# Altium footprint library con-samtec.PCBLIB: 805 footprints (part 17 of 55)
Each footprint in its own frame and in the unit in brackets; x right, y up, seen from the top. Pads: shape width x height; smd on the part's side, far side on the other; paste and mask are expansions set on the pad; w line width, h text height; cw(c..) or ccw(c..) is an arc to the next point about the centre after c.
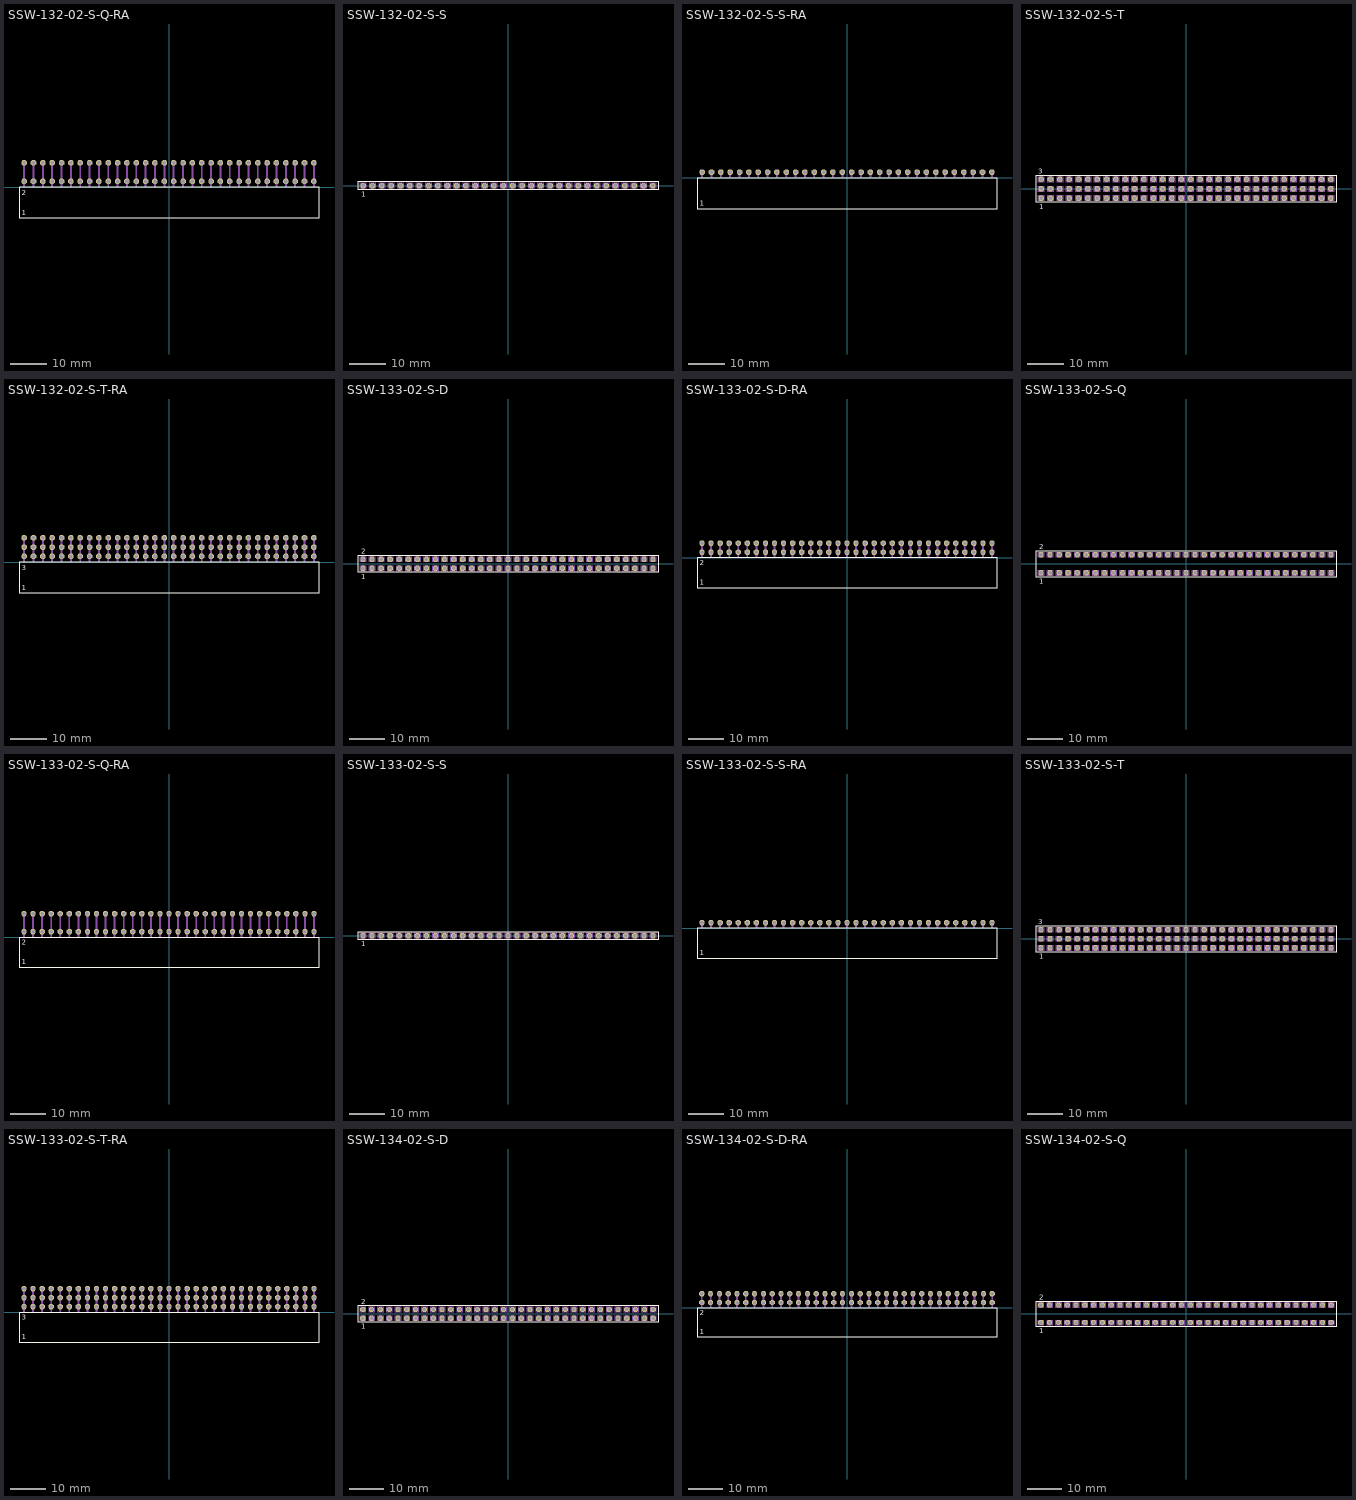
[diagram p16: the footprints below, top view; thin cyan lines are the x and y axes]

## SSW-132-02-S-Q-RA [mil]
pads (64):
  oct 59.06x59.06 hole 39.37: 1(-1550,60) 2(-1550,260) 3(-1450,60) 4(-1450,260) 5(-1350,60) 6(-1350,260) 7(-1250,60) 8(-1250,260) 9(-1150,60) 10(-1150,260) 11(-1050,60) 12(-1050,260) 13(-950,60) 14(-950,260) 15(-850,60) 16(-850,260) 17(-750,60) 18(-750,260) 19(-650,60) 20(-650,260) 21(-550,60) 22(-550,260) 23(-450,60) 24(-450,260) 25(-350,60) 26(-350,260) 27(-250,60) 28(-250,260) 29(-150,60) 30(-150,260) 31(-50,60) 32(-50,260) 33(50,60) 34(50,260) 35(150,60) 36(150,260) 37(250,60) 38(250,260) 39(350,60) 40(350,260) 41(450,60) 42(450,260) 43(550,60) 44(550,260) 45(650,60) 46(650,260) 47(750,60) 48(750,260) 49(850,60) 50(850,260) 51(950,60) 52(950,260) 53(1050,60) 54(1050,260) 55(1150,60) 56(1150,260) 57(1250,60) 58(1250,260) 59(1350,60) 60(1350,260) 61(1450,60) 62(1450,260) 63(1550,60) 64(1550,260)
Top Overlay:
  lines w8: -1605.08,-330.55 1605.08,-330.55 1605.08,-4.17 -1605.08,-4.17 -1605.08,-330.55
  text "1" at -1573.43,-301.18 h56.1
  text "2" at -1576.38,-86.61 h56.1
Mechanical 16:
  rectangle: -1560,0 -1540,270
  rectangle: -1460,0 -1440,270
  rectangle: -1360,0 -1340,270
  rectangle: -1260,0 -1240,270
  rectangle: -1160,0 -1140,270
  rectangle: -1060,0 -1040,270
  rectangle: -960,0 -940,270
  rectangle: -860,0 -840,270
  rectangle: -760,0 -740,270
  rectangle: -660,0 -640,270
  rectangle: -560,0 -540,270
  rectangle: -460,0 -440,270
  rectangle: -360,0 -340,270
  rectangle: -260,0 -240,270
  rectangle: -160,0 -140,270
  rectangle: -60,0 -40,270
  rectangle: 40,0 60,270
  rectangle: 140,0 160,270
  rectangle: 240,0 260,270
  rectangle: 340,0 360,270
  rectangle: 440,0 460,270
  rectangle: 540,0 560,270
  rectangle: 640,0 660,270
  rectangle: 740,0 760,270
  rectangle: 840,0 860,270
  rectangle: 940,0 960,270
  rectangle: 1040,0 1060,270
  rectangle: 1140,0 1160,270
  rectangle: 1240,0 1260,270
  rectangle: 1340,0 1360,270
  rectangle: 1440,0 1460,270
  rectangle: 1540,0 1560,270

## SSW-132-02-S-S [mm]
pads (32):
  oct 1.5x1.5 hole 1: 1(-39.37,0) 2(-36.83,0) 3(-34.29,0) 4(-31.75,0) 5(-29.21,0) 6(-26.67,0) 7(-24.13,0) 8(-21.59,0) 9(-19.05,0) 10(-16.51,0) 11(-13.97,0) 12(-11.43,0) 13(-8.89,0) 14(-6.35,0) 15(-3.81,0) 16(-1.27,0) 17(1.27,0) 18(3.81,0) 19(6.35,0) 20(8.89,0) 21(11.43,0) 22(13.97,0) 23(16.51,0) 24(19.05,0) 25(21.59,0) 26(24.13,0) 27(26.67,0) 28(29.21,0) 29(31.75,0) 30(34.29,0) 31(36.83,0) 32(39.37,0)
Top Overlay:
  lines w0.203: -40.769,-1.155 40.769,-1.155 40.769,1.155 -40.769,1.155 -40.769,-1.155
  text "1" at -39.878,-3.048 h1.42
Mechanical 16:
  lines w0.203: -40.115,-0.745 -38.615,-0.745 -38.615,0.755 -40.115,0.755 -40.115,-0.745 ; -37.575,-0.745 -36.075,-0.745 -36.075,0.755 -37.575,0.755 -37.575,-0.745 ; -35.035,-0.745 -33.535,-0.745 -33.535,0.755 -35.035,0.755 -35.035,-0.745 ; -32.495,-0.745 -30.995,-0.745 -30.995,0.755 -32.495,0.755 -32.495,-0.745 ; -29.955,-0.745 -28.455,-0.745 -28.455,0.755 -29.955,0.755 -29.955,-0.745 ; -27.415,-0.745 -25.915,-0.745 -25.915,0.755 -27.415,0.755 -27.415,-0.745 ; -24.875,-0.745 -23.375,-0.745 -23.375,0.755 -24.875,0.755 -24.875,-0.745 ; -22.335,-0.745 -20.835,-0.745 -20.835,0.755 -22.335,0.755 -22.335,-0.745 ; -19.795,-0.745 -18.295,-0.745 -18.295,0.755 -19.795,0.755 -19.795,-0.745 ; -17.255,-0.745 -15.755,-0.745 -15.755,0.755 -17.255,0.755 -17.255,-0.745 ; -14.715,-0.745 -13.215,-0.745 -13.215,0.755 -14.715,0.755 -14.715,-0.745 ; -12.175,-0.745 -10.675,-0.745 -10.675,0.755 -12.175,0.755 -12.175,-0.745 ; -9.635,-0.745 -8.135,-0.745 -8.135,0.755 -9.635,0.755 -9.635,-0.745 ; -7.095,-0.745 -5.595,-0.745 -5.595,0.755 -7.095,0.755 -7.095,-0.745 ; -4.555,-0.745 -3.055,-0.745 -3.055,0.755 -4.555,0.755 -4.555,-0.745 ; -2.015,-0.745 -0.515,-0.745 -0.515,0.755 -2.015,0.755 -2.015,-0.745 ; 0.525,-0.745 2.025,-0.745 2.025,0.755 0.525,0.755 0.525,-0.745 ; 3.065,-0.745 4.565,-0.745 4.565,0.755 3.065,0.755 3.065,-0.745 ; 5.605,-0.745 7.105,-0.745 7.105,0.755 5.605,0.755 5.605,-0.745 ; 8.145,-0.745 9.645,-0.745 9.645,0.755 8.145,0.755 8.145,-0.745 ; 10.685,-0.745 12.185,-0.745 12.185,0.755 10.685,0.755 10.685,-0.745 ; 13.225,-0.745 14.725,-0.745 14.725,0.755 13.225,0.755 13.225,-0.745 ; 15.765,-0.745 17.265,-0.745 17.265,0.755 15.765,0.755 15.765,-0.745 ; 18.305,-0.745 19.805,-0.745 19.805,0.755 18.305,0.755 18.305,-0.745 ; 20.845,-0.745 22.345,-0.745 22.345,0.755 20.845,0.755 20.845,-0.745 ; 23.385,-0.745 24.885,-0.745 24.885,0.755 23.385,0.755 23.385,-0.745 ; 25.925,-0.745 27.425,-0.745 27.425,0.755 25.925,0.755 25.925,-0.745 ; 28.465,-0.745 29.965,-0.745 29.965,0.755 28.465,0.755 28.465,-0.745 ; 31.005,-0.745 32.505,-0.745 32.505,0.755 31.005,0.755 31.005,-0.745 ; 33.545,-0.745 35.045,-0.745 35.045,0.755 33.545,0.755 33.545,-0.745 ; 36.085,-0.745 37.585,-0.745 37.585,0.755 36.085,0.755 36.085,-0.745 ; 38.625,-0.745 40.125,-0.745 40.125,0.755 38.625,0.755 38.625,-0.745

## SSW-132-02-S-S-RA [mil]
pads (32):
  oct 59.06x59.06 hole 39.37: 1(-1550,60) 2(-1450,60) 3(-1350,60) 4(-1250,60) 5(-1150,60) 6(-1050,60) 7(-950,60) 8(-850,60) 9(-750,60) 10(-650,60) 11(-550,60) 12(-450,60) 13(-350,60) 14(-250,60) 15(-150,60) 16(-50,60) 17(50,60) 18(150,60) 19(250,60) 20(350,60) 21(450,60) 22(550,60) 23(650,60) 24(750,60) 25(850,60) 26(950,60) 27(1050,60) 28(1150,60) 29(1250,60) 30(1350,60) 31(1450,60) 32(1550,60)
Top Overlay:
  lines w8: -1605.08,-330.55 1605.08,-330.55 1605.08,-4.17 -1605.08,-4.17 -1605.08,-330.55
  text "1" at -1573.43,-301.18 h56.1
Mechanical 16:
  rectangle: -1560,0 -1540,70
  rectangle: -1460,0 -1440,70
  rectangle: -1360,0 -1340,70
  rectangle: -1260,0 -1240,70
  rectangle: -1160,0 -1140,70
  rectangle: -1060,0 -1040,70
  rectangle: -960,0 -940,70
  rectangle: -860,0 -840,70
  rectangle: -760,0 -740,70
  rectangle: -660,0 -640,70
  rectangle: -560,0 -540,70
  rectangle: -460,0 -440,70
  rectangle: -360,0 -340,70
  rectangle: -260,0 -240,70
  rectangle: -160,0 -140,70
  rectangle: -60,0 -40,70
  rectangle: 40,0 60,70
  rectangle: 140,0 160,70
  rectangle: 240,0 260,70
  rectangle: 340,0 360,70
  rectangle: 440,0 460,70
  rectangle: 540,0 560,70
  rectangle: 640,0 660,70
  rectangle: 740,0 760,70
  rectangle: 840,0 860,70
  rectangle: 940,0 960,70
  rectangle: 1040,0 1060,70
  rectangle: 1140,0 1160,70
  rectangle: 1240,0 1260,70
  rectangle: 1340,0 1360,70
  rectangle: 1440,0 1460,70
  rectangle: 1540,0 1560,70

## SSW-132-02-S-T [mm]
pads (96):
  oct 1.5x1.5 hole 1: 1(-39.37,-2.54) 2(-39.37,0) 3(-39.37,2.54) 4(-36.83,-2.54) 5(-36.83,0) 6(-36.83,2.54) 7(-34.29,-2.54) 8(-34.29,0) 9(-34.29,2.54) 10(-31.75,-2.54) 11(-31.75,0) 12(-31.75,2.54) 13(-29.21,-2.54) 14(-29.21,0) 15(-29.21,2.54) 16(-26.67,-2.54) 17(-26.67,0) 18(-26.67,2.54) 19(-24.13,-2.54) 20(-24.13,0) 21(-24.13,2.54) 22(-21.59,-2.54) 23(-21.59,0) 24(-21.59,2.54) 25(-19.05,-2.54) 26(-19.05,0) 27(-19.05,2.54) 28(-16.51,-2.54) 29(-16.51,0) 30(-16.51,2.54) 31(-13.97,-2.54) 32(-13.97,0) 33(-13.97,2.54) 34(-11.43,-2.54) 35(-11.43,0) 36(-11.43,2.54) 37(-8.89,-2.54) 38(-8.89,0) 39(-8.89,2.54) 40(-6.35,-2.54) 41(-6.35,0) 42(-6.35,2.54) 43(-3.81,-2.54) 44(-3.81,0) 45(-3.81,2.54) 46(-1.27,-2.54) 47(-1.27,0) 48(-1.27,2.54) 49(1.27,-2.54) 50(1.27,0) 51(1.27,2.54) 52(3.81,-2.54) 53(3.81,0) 54(3.81,2.54) 55(6.35,-2.54) 56(6.35,0) 57(6.35,2.54) 58(8.89,-2.54) 59(8.89,0) 60(8.89,2.54) 61(11.43,-2.54) 62(11.43,0) 63(11.43,2.54) 64(13.97,-2.54) 65(13.97,0) 66(13.97,2.54) 67(16.51,-2.54) 68(16.51,0) 69(16.51,2.54) 70(19.05,-2.54) 71(19.05,0) 72(19.05,2.54) 73(21.59,-2.54) 74(21.59,0) 75(21.59,2.54) 76(24.13,-2.54) 77(24.13,0) 78(24.13,2.54) 79(26.67,-2.54) 80(26.67,0) 81(26.67,2.54) 82(29.21,-2.54) 83(29.21,0) 84(29.21,2.54) 85(31.75,-2.54) 86(31.75,0) 87(31.75,2.54) 88(34.29,-2.54) 89(34.29,0) 90(34.29,2.54) 91(36.83,-2.54) 92(36.83,0) 93(36.83,2.54) 94(39.37,-2.54) 95(39.37,0) 96(39.37,2.54)
Top Overlay:
  lines w0.203: -40.769,-3.695 40.769,-3.695 40.769,3.695 -40.769,3.695 -40.769,-3.695
  text "1" at -39.878,-5.588 h1.42
  text "3" at -40.132,4.064 h1.42
Mechanical 16:
  drawing of 384 lines, arcs and shapes, not listed

## SSW-132-02-S-T-RA [mil]
pads (96):
  oct 59.06x59.06 hole 39.37: 1(-1550,60) 2(-1550,160) 3(-1550,260) 4(-1450,60) 5(-1450,160) 6(-1450,260) 7(-1350,60) 8(-1350,160) 9(-1350,260) 10(-1250,60) 11(-1250,160) 12(-1250,260) 13(-1150,60) 14(-1150,160) 15(-1150,260) 16(-1050,60) 17(-1050,160) 18(-1050,260) 19(-950,60) 20(-950,160) 21(-950,260) 22(-850,60) 23(-850,160) 24(-850,260) 25(-750,60) 26(-750,160) 27(-750,260) 28(-650,60) 29(-650,160) 30(-650,260) 31(-550,60) 32(-550,160) 33(-550,260) 34(-450,60) 35(-450,160) 36(-450,260) 37(-350,60) 38(-350,160) 39(-350,260) 40(-250,60) 41(-250,160) 42(-250,260) 43(-150,60) 44(-150,160) 45(-150,260) 46(-50,60) 47(-50,160) 48(-50,260) 49(50,60) 50(50,160) 51(50,260) 52(150,60) 53(150,160) 54(150,260) 55(250,60) 56(250,160) 57(250,260) 58(350,60) 59(350,160) 60(350,260) 61(450,60) 62(450,160) 63(450,260) 64(550,60) 65(550,160) 66(550,260) 67(650,60) 68(650,160) 69(650,260) 70(750,60) 71(750,160) 72(750,260) 73(850,60) 74(850,160) 75(850,260) 76(950,60) 77(950,160) 78(950,260) 79(1050,60) 80(1050,160) 81(1050,260) 82(1150,60) 83(1150,160) 84(1150,260) 85(1250,60) 86(1250,160) 87(1250,260) 88(1350,60) 89(1350,160) 90(1350,260) 91(1450,60) 92(1450,160) 93(1450,260) 94(1550,60) 95(1550,160) 96(1550,260)
Top Overlay:
  lines w8: -1605.08,-330.55 1605.08,-330.55 1605.08,-4.17 -1605.08,-4.17 -1605.08,-330.55
  text "1" at -1573.43,-301.18 h56.1
  text "3" at -1576.38,-86.61 h56.1
Mechanical 16:
  rectangle: -1560,0 -1540,270
  rectangle: -1460,0 -1440,270
  rectangle: -1360,0 -1340,270
  rectangle: -1260,0 -1240,270
  rectangle: -1160,0 -1140,270
  rectangle: -1060,0 -1040,270
  rectangle: -960,0 -940,270
  rectangle: -860,0 -840,270
  rectangle: -760,0 -740,270
  rectangle: -660,0 -640,270
  rectangle: -560,0 -540,270
  rectangle: -460,0 -440,270
  rectangle: -360,0 -340,270
  rectangle: -260,0 -240,270
  rectangle: -160,0 -140,270
  rectangle: -60,0 -40,270
  rectangle: 40,0 60,270
  rectangle: 140,0 160,270
  rectangle: 240,0 260,270
  rectangle: 340,0 360,270
  rectangle: 440,0 460,270
  rectangle: 540,0 560,270
  rectangle: 640,0 660,270
  rectangle: 740,0 760,270
  rectangle: 840,0 860,270
  rectangle: 940,0 960,270
  rectangle: 1040,0 1060,270
  rectangle: 1140,0 1160,270
  rectangle: 1240,0 1260,270
  rectangle: 1340,0 1360,270
  rectangle: 1440,0 1460,270
  rectangle: 1540,0 1560,270

## SSW-133-02-S-D [mm]
pads (66):
  oct 1.5x1.5 hole 1: 1(-40.64,-1.27) 2(-40.64,1.27) 3(-38.1,-1.27) 4(-38.1,1.27) 5(-35.56,-1.27) 6(-35.56,1.27) 7(-33.02,-1.27) 8(-33.02,1.27) 9(-30.48,-1.27) 10(-30.48,1.27) 11(-27.94,-1.27) 12(-27.94,1.27) 13(-25.4,-1.27) 14(-25.4,1.27) 15(-22.86,-1.27) 16(-22.86,1.27) 17(-20.32,-1.27) 18(-20.32,1.27) 19(-17.78,-1.27) 20(-17.78,1.27) 21(-15.24,-1.27) 22(-15.24,1.27) 23(-12.7,-1.27) 24(-12.7,1.27) 25(-10.16,-1.27) 26(-10.16,1.27) 27(-7.62,-1.27) 28(-7.62,1.27) 29(-5.08,-1.27) 30(-5.08,1.27) 31(-2.54,-1.27) 32(-2.54,1.27) 33(0,-1.27) 34(0,1.27) 35(2.54,-1.27) 36(2.54,1.27) 37(5.08,-1.27) 38(5.08,1.27) 39(7.62,-1.27) 40(7.62,1.27) 41(10.16,-1.27) 42(10.16,1.27) 43(12.7,-1.27) 44(12.7,1.27) 45(15.24,-1.27) 46(15.24,1.27) 47(17.78,-1.27) 48(17.78,1.27) 49(20.32,-1.27) 50(20.32,1.27) 51(22.86,-1.27) 52(22.86,1.27) 53(25.4,-1.27) 54(25.4,1.27) 55(27.94,-1.27) 56(27.94,1.27) 57(30.48,-1.27) 58(30.48,1.27) 59(33.02,-1.27) 60(33.02,1.27) 61(35.56,-1.27) 62(35.56,1.27) 63(38.1,-1.27) 64(38.1,1.27) 65(40.64,-1.27) 66(40.64,1.27)
Top Overlay:
  lines w0.203: -42.039,-2.425 42.039,-2.425 42.039,2.425 -42.039,2.425 -42.039,-2.425
  text "1" at -41.148,-4.318 h1.42
  text "2" at -41.148,2.794 h1.42
Mechanical 16:
  drawing of 264 lines, arcs and shapes, not listed

## SSW-133-02-S-D-RA [mil]
pads (66):
  oct 59.06x59.06 hole 39.37: 1(-1600,60) 2(-1600,160) 3(-1500,60) 4(-1500,160) 5(-1400,60) 6(-1400,160) 7(-1300,60) 8(-1300,160) 9(-1200,60) 10(-1200,160) 11(-1100,60) 12(-1100,160) 13(-1000,60) 14(-1000,160) 15(-900,60) 16(-900,160) 17(-800,60) 18(-800,160) 19(-700,60) 20(-700,160) 21(-600,60) 22(-600,160) 23(-500,60) 24(-500,160) 25(-400,60) 26(-400,160) 27(-300,60) 28(-300,160) 29(-200,60) 30(-200,160) 31(-100,60) 32(-100,160) 33(0,60) 34(0,160) 35(100,60) 36(100,160) 37(200,60) 38(200,160) 39(300,60) 40(300,160) 41(400,60) 42(400,160) 43(500,60) 44(500,160) 45(600,60) 46(600,160) 47(700,60) 48(700,160) 49(800,60) 50(800,160) 51(900,60) 52(900,160) 53(1000,60) 54(1000,160) 55(1100,60) 56(1100,160) 57(1200,60) 58(1200,160) 59(1300,60) 60(1300,160) 61(1400,60) 62(1400,160) 63(1500,60) 64(1500,160) 65(1600,60) 66(1600,160)
Top Overlay:
  lines w8: -1655.08,-330.55 1655.08,-330.55 1655.08,-4.17 -1655.08,-4.17 -1655.08,-330.55
  text "1" at -1623.43,-301.18 h56.1
  text "2" at -1626.38,-86.61 h56.1
Mechanical 16:
  rectangle: -1610,0 -1590,170
  rectangle: -1510,0 -1490,170
  rectangle: -1410,0 -1390,170
  rectangle: -1310,0 -1290,170
  rectangle: -1210,0 -1190,170
  rectangle: -1110,0 -1090,170
  rectangle: -1010,0 -990,170
  rectangle: -910,0 -890,170
  rectangle: -810,0 -790,170
  rectangle: -710,0 -690,170
  rectangle: -610,0 -590,170
  rectangle: -510,0 -490,170
  rectangle: -410,0 -390,170
  rectangle: -310,0 -290,170
  rectangle: -210,0 -190,170
  rectangle: -110,0 -90,170
  rectangle: -10,0 10,170
  rectangle: 90,0 110,170
  rectangle: 190,0 210,170
  rectangle: 290,0 310,170
  rectangle: 390,0 410,170
  rectangle: 490,0 510,170
  rectangle: 590,0 610,170
  rectangle: 690,0 710,170
  rectangle: 790,0 810,170
  rectangle: 890,0 910,170
  rectangle: 990,0 1010,170
  rectangle: 1090,0 1110,170
  rectangle: 1190,0 1210,170
  rectangle: 1290,0 1310,170
  rectangle: 1390,0 1410,170
  rectangle: 1490,0 1510,170
  rectangle: 1590,0 1610,170

## SSW-133-02-S-Q [mm]
pads (66):
  oct 1.5x1.5 hole 1: 1(-40.64,-2.54) 2(-40.64,2.54) 3(-38.1,-2.54) 4(-38.1,2.54) 5(-35.56,-2.54) 6(-35.56,2.54) 7(-33.02,-2.54) 8(-33.02,2.54) 9(-30.48,-2.54) 10(-30.48,2.54) 11(-27.94,-2.54) 12(-27.94,2.54) 13(-25.4,-2.54) 14(-25.4,2.54) 15(-22.86,-2.54) 16(-22.86,2.54) 17(-20.32,-2.54) 18(-20.32,2.54) 19(-17.78,-2.54) 20(-17.78,2.54) 21(-15.24,-2.54) 22(-15.24,2.54) 23(-12.7,-2.54) 24(-12.7,2.54) 25(-10.16,-2.54) 26(-10.16,2.54) 27(-7.62,-2.54) 28(-7.62,2.54) 29(-5.08,-2.54) 30(-5.08,2.54) 31(-2.54,-2.54) 32(-2.54,2.54) 33(0,-2.54) 34(0,2.54) 35(2.54,-2.54) 36(2.54,2.54) 37(5.08,-2.54) 38(5.08,2.54) 39(7.62,-2.54) 40(7.62,2.54) 41(10.16,-2.54) 42(10.16,2.54) 43(12.7,-2.54) 44(12.7,2.54) 45(15.24,-2.54) 46(15.24,2.54) 47(17.78,-2.54) 48(17.78,2.54) 49(20.32,-2.54) 50(20.32,2.54) 51(22.86,-2.54) 52(22.86,2.54) 53(25.4,-2.54) 54(25.4,2.54) 55(27.94,-2.54) 56(27.94,2.54) 57(30.48,-2.54) 58(30.48,2.54) 59(33.02,-2.54) 60(33.02,2.54) 61(35.56,-2.54) 62(35.56,2.54) 63(38.1,-2.54) 64(38.1,2.54) 65(40.64,-2.54) 66(40.64,2.54)
Top Overlay:
  lines w0.203: -42.039,-3.695 42.039,-3.695 42.039,3.695 -42.039,3.695 -42.039,-3.695
  text "1" at -41.148,-5.588 h1.42
  text "2" at -41.148,4.064 h1.42
Mechanical 16:
  drawing of 264 lines, arcs and shapes, not listed

## SSW-133-02-S-Q-RA [mil]
pads (66):
  oct 59.06x59.06 hole 39.37: 1(-1600,60) 2(-1600,260) 3(-1500,60) 4(-1500,260) 5(-1400,60) 6(-1400,260) 7(-1300,60) 8(-1300,260) 9(-1200,60) 10(-1200,260) 11(-1100,60) 12(-1100,260) 13(-1000,60) 14(-1000,260) 15(-900,60) 16(-900,260) 17(-800,60) 18(-800,260) 19(-700,60) 20(-700,260) 21(-600,60) 22(-600,260) 23(-500,60) 24(-500,260) 25(-400,60) 26(-400,260) 27(-300,60) 28(-300,260) 29(-200,60) 30(-200,260) 31(-100,60) 32(-100,260) 33(0,60) 34(0,260) 35(100,60) 36(100,260) 37(200,60) 38(200,260) 39(300,60) 40(300,260) 41(400,60) 42(400,260) 43(500,60) 44(500,260) 45(600,60) 46(600,260) 47(700,60) 48(700,260) 49(800,60) 50(800,260) 51(900,60) 52(900,260) 53(1000,60) 54(1000,260) 55(1100,60) 56(1100,260) 57(1200,60) 58(1200,260) 59(1300,60) 60(1300,260) 61(1400,60) 62(1400,260) 63(1500,60) 64(1500,260) 65(1600,60) 66(1600,260)
Top Overlay:
  lines w8: -1655.08,-330.55 1655.08,-330.55 1655.08,-4.17 -1655.08,-4.17 -1655.08,-330.55
  text "1" at -1623.43,-301.18 h56.1
  text "2" at -1626.38,-86.61 h56.1
Mechanical 16:
  rectangle: -1610,0 -1590,270
  rectangle: -1510,0 -1490,270
  rectangle: -1410,0 -1390,270
  rectangle: -1310,0 -1290,270
  rectangle: -1210,0 -1190,270
  rectangle: -1110,0 -1090,270
  rectangle: -1010,0 -990,270
  rectangle: -910,0 -890,270
  rectangle: -810,0 -790,270
  rectangle: -710,0 -690,270
  rectangle: -610,0 -590,270
  rectangle: -510,0 -490,270
  rectangle: -410,0 -390,270
  rectangle: -310,0 -290,270
  rectangle: -210,0 -190,270
  rectangle: -110,0 -90,270
  rectangle: -10,0 10,270
  rectangle: 90,0 110,270
  rectangle: 190,0 210,270
  rectangle: 290,0 310,270
  rectangle: 390,0 410,270
  rectangle: 490,0 510,270
  rectangle: 590,0 610,270
  rectangle: 690,0 710,270
  rectangle: 790,0 810,270
  rectangle: 890,0 910,270
  rectangle: 990,0 1010,270
  rectangle: 1090,0 1110,270
  rectangle: 1190,0 1210,270
  rectangle: 1290,0 1310,270
  rectangle: 1390,0 1410,270
  rectangle: 1490,0 1510,270
  rectangle: 1590,0 1610,270

## SSW-133-02-S-S [mm]
pads (33):
  oct 1.5x1.5 hole 1: 1(-40.64,0) 2(-38.1,0) 3(-35.56,0) 4(-33.02,0) 5(-30.48,0) 6(-27.94,0) 7(-25.4,0) 8(-22.86,0) 9(-20.32,0) 10(-17.78,0) 11(-15.24,0) 12(-12.7,0) 13(-10.16,0) 14(-7.62,0) 15(-5.08,0) 16(-2.54,0) 17(0,0) 18(2.54,0) 19(5.08,0) 20(7.62,0) 21(10.16,0) 22(12.7,0) 23(15.24,0) 24(17.78,0) 25(20.32,0) 26(22.86,0) 27(25.4,0) 28(27.94,0) 29(30.48,0) 30(33.02,0) 31(35.56,0) 32(38.1,0) 33(40.64,0)
Top Overlay:
  lines w0.203: -42.039,-1.155 42.039,-1.155 42.039,1.155 -42.039,1.155 -42.039,-1.155
  text "1" at -41.148,-3.048 h1.42
Mechanical 16:
  lines w0.203: -41.385,-0.745 -39.885,-0.745 -39.885,0.755 -41.385,0.755 -41.385,-0.745 ; -38.845,-0.745 -37.345,-0.745 -37.345,0.755 -38.845,0.755 -38.845,-0.745 ; -36.305,-0.745 -34.805,-0.745 -34.805,0.755 -36.305,0.755 -36.305,-0.745 ; -33.765,-0.745 -32.265,-0.745 -32.265,0.755 -33.765,0.755 -33.765,-0.745 ; -31.225,-0.745 -29.725,-0.745 -29.725,0.755 -31.225,0.755 -31.225,-0.745 ; -28.685,-0.745 -27.185,-0.745 -27.185,0.755 -28.685,0.755 -28.685,-0.745 ; -26.145,-0.745 -24.645,-0.745 -24.645,0.755 -26.145,0.755 -26.145,-0.745 ; -23.605,-0.745 -22.105,-0.745 -22.105,0.755 -23.605,0.755 -23.605,-0.745 ; -21.065,-0.745 -19.565,-0.745 -19.565,0.755 -21.065,0.755 -21.065,-0.745 ; -18.525,-0.745 -17.025,-0.745 -17.025,0.755 -18.525,0.755 -18.525,-0.745 ; -15.985,-0.745 -14.485,-0.745 -14.485,0.755 -15.985,0.755 -15.985,-0.745 ; -13.445,-0.745 -11.945,-0.745 -11.945,0.755 -13.445,0.755 -13.445,-0.745 ; -10.905,-0.745 -9.405,-0.745 -9.405,0.755 -10.905,0.755 -10.905,-0.745 ; -8.365,-0.745 -6.865,-0.745 -6.865,0.755 -8.365,0.755 -8.365,-0.745 ; -5.825,-0.745 -4.325,-0.745 -4.325,0.755 -5.825,0.755 -5.825,-0.745 ; -3.285,-0.745 -1.785,-0.745 -1.785,0.755 -3.285,0.755 -3.285,-0.745 ; -0.745,-0.745 0.755,-0.745 0.755,0.755 -0.745,0.755 -0.745,-0.745 ; 1.795,-0.745 3.295,-0.745 3.295,0.755 1.795,0.755 1.795,-0.745 ; 4.335,-0.745 5.835,-0.745 5.835,0.755 4.335,0.755 4.335,-0.745 ; 6.875,-0.745 8.375,-0.745 8.375,0.755 6.875,0.755 6.875,-0.745 ; 9.415,-0.745 10.915,-0.745 10.915,0.755 9.415,0.755 9.415,-0.745 ; 11.955,-0.745 13.455,-0.745 13.455,0.755 11.955,0.755 11.955,-0.745 ; 14.495,-0.745 15.995,-0.745 15.995,0.755 14.495,0.755 14.495,-0.745 ; 17.035,-0.745 18.535,-0.745 18.535,0.755 17.035,0.755 17.035,-0.745 ; 19.575,-0.745 21.075,-0.745 21.075,0.755 19.575,0.755 19.575,-0.745 ; 22.115,-0.745 23.615,-0.745 23.615,0.755 22.115,0.755 22.115,-0.745 ; 24.655,-0.745 26.155,-0.745 26.155,0.755 24.655,0.755 24.655,-0.745 ; 27.195,-0.745 28.695,-0.745 28.695,0.755 27.195,0.755 27.195,-0.745 ; 29.735,-0.745 31.235,-0.745 31.235,0.755 29.735,0.755 29.735,-0.745 ; 32.275,-0.745 33.775,-0.745 33.775,0.755 32.275,0.755 32.275,-0.745 ; 34.815,-0.745 36.315,-0.745 36.315,0.755 34.815,0.755 34.815,-0.745 ; 37.355,-0.745 38.855,-0.745 38.855,0.755 37.355,0.755 37.355,-0.745 ; 39.895,-0.745 41.395,-0.745 41.395,0.755 39.895,0.755 39.895,-0.745

## SSW-133-02-S-S-RA [mil]
pads (33):
  oct 59.06x59.06 hole 39.37: 1(-1600,60) 2(-1500,60) 3(-1400,60) 4(-1300,60) 5(-1200,60) 6(-1100,60) 7(-1000,60) 8(-900,60) 9(-800,60) 10(-700,60) 11(-600,60) 12(-500,60) 13(-400,60) 14(-300,60) 15(-200,60) 16(-100,60) 17(0,60) 18(100,60) 19(200,60) 20(300,60) 21(400,60) 22(500,60) 23(600,60) 24(700,60) 25(800,60) 26(900,60) 27(1000,60) 28(1100,60) 29(1200,60) 30(1300,60) 31(1400,60) 32(1500,60) 33(1600,60)
Top Overlay:
  lines w8: -1655.08,-330.55 1655.08,-330.55 1655.08,-4.17 -1655.08,-4.17 -1655.08,-330.55
  text "1" at -1623.43,-301.18 h56.1
Mechanical 16:
  rectangle: -1610,0 -1590,70
  rectangle: -1510,0 -1490,70
  rectangle: -1410,0 -1390,70
  rectangle: -1310,0 -1290,70
  rectangle: -1210,0 -1190,70
  rectangle: -1110,0 -1090,70
  rectangle: -1010,0 -990,70
  rectangle: -910,0 -890,70
  rectangle: -810,0 -790,70
  rectangle: -710,0 -690,70
  rectangle: -610,0 -590,70
  rectangle: -510,0 -490,70
  rectangle: -410,0 -390,70
  rectangle: -310,0 -290,70
  rectangle: -210,0 -190,70
  rectangle: -110,0 -90,70
  rectangle: -10,0 10,70
  rectangle: 90,0 110,70
  rectangle: 190,0 210,70
  rectangle: 290,0 310,70
  rectangle: 390,0 410,70
  rectangle: 490,0 510,70
  rectangle: 590,0 610,70
  rectangle: 690,0 710,70
  rectangle: 790,0 810,70
  rectangle: 890,0 910,70
  rectangle: 990,0 1010,70
  rectangle: 1090,0 1110,70
  rectangle: 1190,0 1210,70
  rectangle: 1290,0 1310,70
  rectangle: 1390,0 1410,70
  rectangle: 1490,0 1510,70
  rectangle: 1590,0 1610,70

## SSW-133-02-S-T [mm]
pads (99):
  oct 1.5x1.5 hole 1: 1(-40.64,-2.54) 2(-40.64,0) 3(-40.64,2.54) 4(-38.1,-2.54) 5(-38.1,0) 6(-38.1,2.54) 7(-35.56,-2.54) 8(-35.56,0) 9(-35.56,2.54) 10(-33.02,-2.54) 11(-33.02,0) 12(-33.02,2.54) 13(-30.48,-2.54) 14(-30.48,0) 15(-30.48,2.54) 16(-27.94,-2.54) 17(-27.94,0) 18(-27.94,2.54) 19(-25.4,-2.54) 20(-25.4,0) 21(-25.4,2.54) 22(-22.86,-2.54) 23(-22.86,0) 24(-22.86,2.54) 25(-20.32,-2.54) 26(-20.32,0) 27(-20.32,2.54) 28(-17.78,-2.54) 29(-17.78,0) 30(-17.78,2.54) 31(-15.24,-2.54) 32(-15.24,0) 33(-15.24,2.54) 34(-12.7,-2.54) 35(-12.7,0) 36(-12.7,2.54) 37(-10.16,-2.54) 38(-10.16,0) 39(-10.16,2.54) 40(-7.62,-2.54) 41(-7.62,0) 42(-7.62,2.54) 43(-5.08,-2.54) 44(-5.08,0) 45(-5.08,2.54) 46(-2.54,-2.54) 47(-2.54,0) 48(-2.54,2.54) 49(0,-2.54) 50(0,0) 51(0,2.54) 52(2.54,-2.54) 53(2.54,0) 54(2.54,2.54) 55(5.08,-2.54) 56(5.08,0) 57(5.08,2.54) 58(7.62,-2.54) 59(7.62,0) 60(7.62,2.54) 61(10.16,-2.54) 62(10.16,0) 63(10.16,2.54) 64(12.7,-2.54) 65(12.7,0) 66(12.7,2.54) 67(15.24,-2.54) 68(15.24,0) 69(15.24,2.54) 70(17.78,-2.54) 71(17.78,0) 72(17.78,2.54) 73(20.32,-2.54) 74(20.32,0) 75(20.32,2.54) 76(22.86,-2.54) 77(22.86,0) 78(22.86,2.54) 79(25.4,-2.54) 80(25.4,0) 81(25.4,2.54) 82(27.94,-2.54) 83(27.94,0) 84(27.94,2.54) 85(30.48,-2.54) 86(30.48,0) 87(30.48,2.54) 88(33.02,-2.54) 89(33.02,0) 90(33.02,2.54) 91(35.56,-2.54) 92(35.56,0) 93(35.56,2.54) 94(38.1,-2.54) 95(38.1,0) 96(38.1,2.54) 97(40.64,-2.54) 98(40.64,0) 99(40.64,2.54)
Top Overlay:
  lines w0.203: -42.039,-3.695 42.039,-3.695 42.039,3.695 -42.039,3.695 -42.039,-3.695
  text "1" at -41.148,-5.588 h1.42
  text "3" at -41.402,4.064 h1.42
Mechanical 16:
  drawing of 396 lines, arcs and shapes, not listed

## SSW-133-02-S-T-RA [mil]
pads (99):
  oct 59.06x59.06 hole 39.37: 1(-1600,60) 2(-1600,160) 3(-1600,260) 4(-1500,60) 5(-1500,160) 6(-1500,260) 7(-1400,60) 8(-1400,160) 9(-1400,260) 10(-1300,60) 11(-1300,160) 12(-1300,260) 13(-1200,60) 14(-1200,160) 15(-1200,260) 16(-1100,60) 17(-1100,160) 18(-1100,260) 19(-1000,60) 20(-1000,160) 21(-1000,260) 22(-900,60) 23(-900,160) 24(-900,260) 25(-800,60) 26(-800,160) 27(-800,260) 28(-700,60) 29(-700,160) 30(-700,260) 31(-600,60) 32(-600,160) 33(-600,260) 34(-500,60) 35(-500,160) 36(-500,260) 37(-400,60) 38(-400,160) 39(-400,260) 40(-300,60) 41(-300,160) 42(-300,260) 43(-200,60) 44(-200,160) 45(-200,260) 46(-100,60) 47(-100,160) 48(-100,260) 49(0,60) 50(0,160) 51(0,260) 52(100,60) 53(100,160) 54(100,260) 55(200,60) 56(200,160) 57(200,260) 58(300,60) 59(300,160) 60(300,260) 61(400,60) 62(400,160) 63(400,260) 64(500,60) 65(500,160) 66(500,260) 67(600,60) 68(600,160) 69(600,260) 70(700,60) 71(700,160) 72(700,260) 73(800,60) 74(800,160) 75(800,260) 76(900,60) 77(900,160) 78(900,260) 79(1000,60) 80(1000,160) 81(1000,260) 82(1100,60) 83(1100,160) 84(1100,260) 85(1200,60) 86(1200,160) 87(1200,260) 88(1300,60) 89(1300,160) 90(1300,260) 91(1400,60) 92(1400,160) 93(1400,260) 94(1500,60) 95(1500,160) 96(1500,260) 97(1600,60) 98(1600,160) 99(1600,260)
Top Overlay:
  lines w8: -1655.08,-330.55 1655.08,-330.55 1655.08,-4.17 -1655.08,-4.17 -1655.08,-330.55
  text "1" at -1623.43,-301.18 h56.1
  text "3" at -1626.38,-86.61 h56.1
Mechanical 16:
  rectangle: -1610,0 -1590,270
  rectangle: -1510,0 -1490,270
  rectangle: -1410,0 -1390,270
  rectangle: -1310,0 -1290,270
  rectangle: -1210,0 -1190,270
  rectangle: -1110,0 -1090,270
  rectangle: -1010,0 -990,270
  rectangle: -910,0 -890,270
  rectangle: -810,0 -790,270
  rectangle: -710,0 -690,270
  rectangle: -610,0 -590,270
  rectangle: -510,0 -490,270
  rectangle: -410,0 -390,270
  rectangle: -310,0 -290,270
  rectangle: -210,0 -190,270
  rectangle: -110,0 -90,270
  rectangle: -10,0 10,270
  rectangle: 90,0 110,270
  rectangle: 190,0 210,270
  rectangle: 290,0 310,270
  rectangle: 390,0 410,270
  rectangle: 490,0 510,270
  rectangle: 590,0 610,270
  rectangle: 690,0 710,270
  rectangle: 790,0 810,270
  rectangle: 890,0 910,270
  rectangle: 990,0 1010,270
  rectangle: 1090,0 1110,270
  rectangle: 1190,0 1210,270
  rectangle: 1290,0 1310,270
  rectangle: 1390,0 1410,270
  rectangle: 1490,0 1510,270
  rectangle: 1590,0 1610,270

## SSW-134-02-S-D [mm]
pads (68):
  oct 1.5x1.5 hole 1: 1(-41.91,-1.27) 2(-41.91,1.27) 3(-39.37,-1.27) 4(-39.37,1.27) 5(-36.83,-1.27) 6(-36.83,1.27) 7(-34.29,-1.27) 8(-34.29,1.27) 9(-31.75,-1.27) 10(-31.75,1.27) 11(-29.21,-1.27) 12(-29.21,1.27) 13(-26.67,-1.27) 14(-26.67,1.27) 15(-24.13,-1.27) 16(-24.13,1.27) 17(-21.59,-1.27) 18(-21.59,1.27) 19(-19.05,-1.27) 20(-19.05,1.27) 21(-16.51,-1.27) 22(-16.51,1.27) 23(-13.97,-1.27) 24(-13.97,1.27) 25(-11.43,-1.27) 26(-11.43,1.27) 27(-8.89,-1.27) 28(-8.89,1.27) 29(-6.35,-1.27) 30(-6.35,1.27) 31(-3.81,-1.27) 32(-3.81,1.27) 33(-1.27,-1.27) 34(-1.27,1.27) 35(1.27,-1.27) 36(1.27,1.27) 37(3.81,-1.27) 38(3.81,1.27) 39(6.35,-1.27) 40(6.35,1.27) 41(8.89,-1.27) 42(8.89,1.27) 43(11.43,-1.27) 44(11.43,1.27) 45(13.97,-1.27) 46(13.97,1.27) 47(16.51,-1.27) 48(16.51,1.27) 49(19.05,-1.27) 50(19.05,1.27) 51(21.59,-1.27) 52(21.59,1.27) 53(24.13,-1.27) 54(24.13,1.27) 55(26.67,-1.27) 56(26.67,1.27) 57(29.21,-1.27) 58(29.21,1.27) 59(31.75,-1.27) 60(31.75,1.27) 61(34.29,-1.27) 62(34.29,1.27) 63(36.83,-1.27) 64(36.83,1.27) 65(39.37,-1.27) 66(39.37,1.27) 67(41.91,-1.27) 68(41.91,1.27)
Top Overlay:
  lines w0.203: -43.309,-2.425 43.309,-2.425 43.309,2.425 -43.309,2.425 -43.309,-2.425
  text "1" at -42.418,-4.318 h1.42
  text "2" at -42.418,2.794 h1.42
Mechanical 16:
  drawing of 272 lines, arcs and shapes, not listed

## SSW-134-02-S-D-RA [mil]
pads (68):
  oct 59.06x59.06 hole 39.37: 1(-1650,60) 2(-1650,160) 3(-1550,60) 4(-1550,160) 5(-1450,60) 6(-1450,160) 7(-1350,60) 8(-1350,160) 9(-1250,60) 10(-1250,160) 11(-1150,60) 12(-1150,160) 13(-1050,60) 14(-1050,160) 15(-950,60) 16(-950,160) 17(-850,60) 18(-850,160) 19(-750,60) 20(-750,160) 21(-650,60) 22(-650,160) 23(-550,60) 24(-550,160) 25(-450,60) 26(-450,160) 27(-350,60) 28(-350,160) 29(-250,60) 30(-250,160) 31(-150,60) 32(-150,160) 33(-50,60) 34(-50,160) 35(50,60) 36(50,160) 37(150,60) 38(150,160) 39(250,60) 40(250,160) 41(350,60) 42(350,160) 43(450,60) 44(450,160) 45(550,60) 46(550,160) 47(650,60) 48(650,160) 49(750,60) 50(750,160) 51(850,60) 52(850,160) 53(950,60) 54(950,160) 55(1050,60) 56(1050,160) 57(1150,60) 58(1150,160) 59(1250,60) 60(1250,160) 61(1350,60) 62(1350,160) 63(1450,60) 64(1450,160) 65(1550,60) 66(1550,160) 67(1650,60) 68(1650,160)
Top Overlay:
  lines w8: -1705.08,-330.55 1705.08,-330.55 1705.08,-4.17 -1705.08,-4.17 -1705.08,-330.55
  text "1" at -1673.43,-301.18 h56.1
  text "2" at -1676.38,-86.61 h56.1
Mechanical 16:
  rectangle: -1660,0 -1640,170
  rectangle: -1560,0 -1540,170
  rectangle: -1460,0 -1440,170
  rectangle: -1360,0 -1340,170
  rectangle: -1260,0 -1240,170
  rectangle: -1160,0 -1140,170
  rectangle: -1060,0 -1040,170
  rectangle: -960,0 -940,170
  rectangle: -860,0 -840,170
  rectangle: -760,0 -740,170
  rectangle: -660,0 -640,170
  rectangle: -560,0 -540,170
  rectangle: -460,0 -440,170
  rectangle: -360,0 -340,170
  rectangle: -260,0 -240,170
  rectangle: -160,0 -140,170
  rectangle: -60,0 -40,170
  rectangle: 40,0 60,170
  rectangle: 140,0 160,170
  rectangle: 240,0 260,170
  rectangle: 340,0 360,170
  rectangle: 440,0 460,170
  rectangle: 540,0 560,170
  rectangle: 640,0 660,170
  rectangle: 740,0 760,170
  rectangle: 840,0 860,170
  rectangle: 940,0 960,170
  rectangle: 1040,0 1060,170
  rectangle: 1140,0 1160,170
  rectangle: 1240,0 1260,170
  rectangle: 1340,0 1360,170
  rectangle: 1440,0 1460,170
  rectangle: 1540,0 1560,170
  rectangle: 1640,0 1660,170

## SSW-134-02-S-Q [mm]
pads (68):
  oct 1.5x1.5 hole 1: 1(-41.91,-2.54) 2(-41.91,2.54) 3(-39.37,-2.54) 4(-39.37,2.54) 5(-36.83,-2.54) 6(-36.83,2.54) 7(-34.29,-2.54) 8(-34.29,2.54) 9(-31.75,-2.54) 10(-31.75,2.54) 11(-29.21,-2.54) 12(-29.21,2.54) 13(-26.67,-2.54) 14(-26.67,2.54) 15(-24.13,-2.54) 16(-24.13,2.54) 17(-21.59,-2.54) 18(-21.59,2.54) 19(-19.05,-2.54) 20(-19.05,2.54) 21(-16.51,-2.54) 22(-16.51,2.54) 23(-13.97,-2.54) 24(-13.97,2.54) 25(-11.43,-2.54) 26(-11.43,2.54) 27(-8.89,-2.54) 28(-8.89,2.54) 29(-6.35,-2.54) 30(-6.35,2.54) 31(-3.81,-2.54) 32(-3.81,2.54) 33(-1.27,-2.54) 34(-1.27,2.54) 35(1.27,-2.54) 36(1.27,2.54) 37(3.81,-2.54) 38(3.81,2.54) 39(6.35,-2.54) 40(6.35,2.54) 41(8.89,-2.54) 42(8.89,2.54) 43(11.43,-2.54) 44(11.43,2.54) 45(13.97,-2.54) 46(13.97,2.54) 47(16.51,-2.54) 48(16.51,2.54) 49(19.05,-2.54) 50(19.05,2.54) 51(21.59,-2.54) 52(21.59,2.54) 53(24.13,-2.54) 54(24.13,2.54) 55(26.67,-2.54) 56(26.67,2.54) 57(29.21,-2.54) 58(29.21,2.54) 59(31.75,-2.54) 60(31.75,2.54) 61(34.29,-2.54) 62(34.29,2.54) 63(36.83,-2.54) 64(36.83,2.54) 65(39.37,-2.54) 66(39.37,2.54) 67(41.91,-2.54) 68(41.91,2.54)
Top Overlay:
  lines w0.203: -43.309,-3.695 43.309,-3.695 43.309,3.695 -43.309,3.695 -43.309,-3.695
  text "1" at -42.418,-5.588 h1.42
  text "2" at -42.418,4.064 h1.42
Mechanical 16:
  drawing of 272 lines, arcs and shapes, not listed